# Altium footprint library Electronic Devices_LIB.PcbLib: 410 footprints (part 5 of 26)
Each footprint in its own frame and in the unit in brackets; x right, y up, seen from the top. Pads: shape width x height; smd on the part's side, far side on the other; paste and mask are expansions set on the pad; w line width, h text height; cw(c..) or ccw(c..) is an arc to the next point about the centre after c.
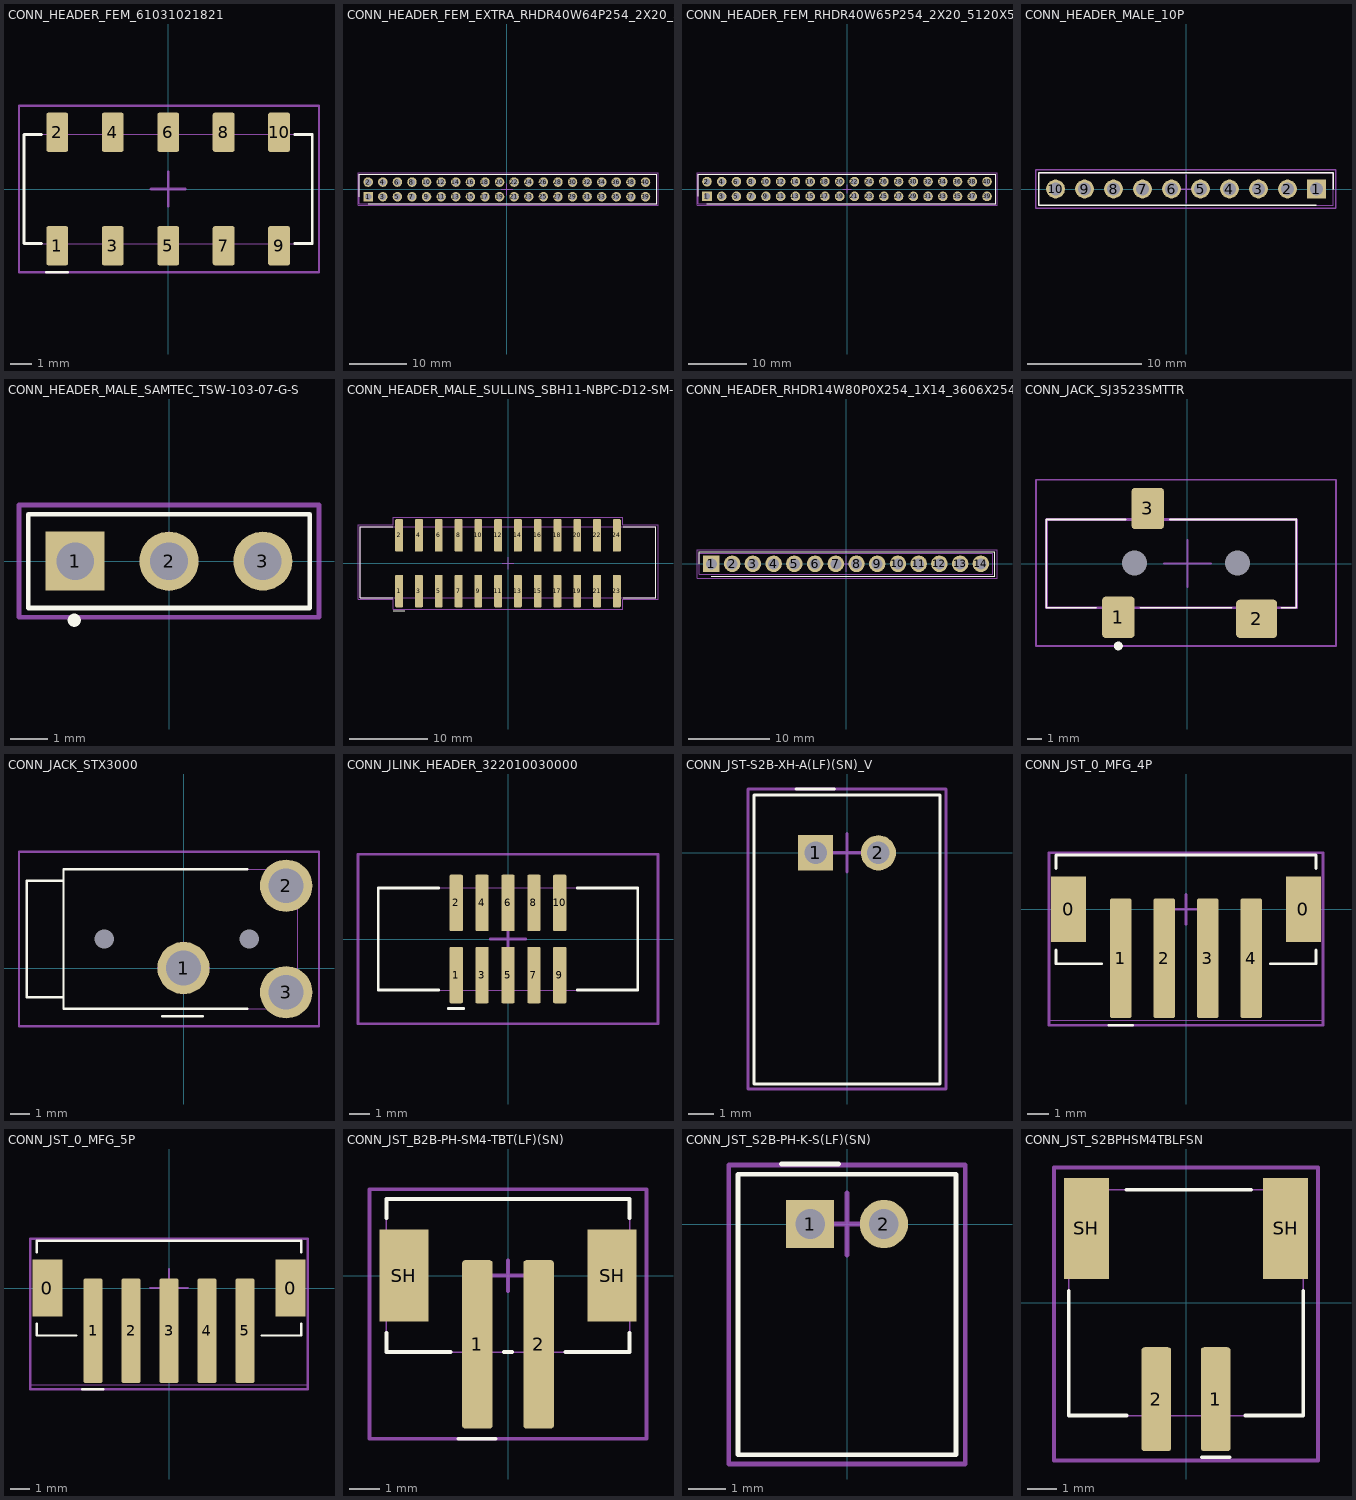
[diagram p4: the footprints below, top view; thin cyan lines are the x and y axes]

## CONN_HEADER_FEM_61031021821 [mm] "0.100\" (2.54mm)"
height 7.6
pads (10):
  rrect20% 1x1.8 smd: 1(-5.08,-2.6) 2(-5.08,2.6) 3(-2.54,-2.6) 4(-2.54,2.6) 5(0,-2.6) 6(0,2.6) 7(2.54,-2.6) 8(2.54,2.6) 9(5.08,-2.6) 10(5.08,2.6)
Top Overlay:
  lines w0.127: -5.8,-2.5 -6.6,-2.5 -6.6,2.5 -5.8,2.5 ; -5.588,-3.81 -4.597,-3.81 ; 5.8,-2.5 6.6,-2.5 6.6,2.5 5.8,2.5
Top Assembly:
  lines w0.051: -6.6,-2.5 -6.6,2.5 6.6,2.5 6.6,-2.5 -6.6,-2.5
Top Courtyard:
  lines w0.1: -6.833,-3.81 -6.833,3.81 6.909,3.81 6.909,-3.81 -6.833,-3.81
  lines w0.127: -0.787,0 0,0 ; 0,-0.787 0,0 ; 0,0.787 0,0 ; 0.787,0 0,0
3D body "61031021821.stp": height 8.5, standoff 0.05, extent -6.6,-3.475 6.6,3.525

## CONN_HEADER_FEM_EXTRA_RHDR40W64P254_2X20_5130X500X1375P [mm]
pads (40):
  rect 1.65x1.65 hole 1.1: 1(-24.13,-1.27)
  round 1.65 hole 1.1: 2(-24.13,1.27) 3(-21.59,-1.27) 4(-21.59,1.27) 5(-19.05,-1.27) 6(-19.05,1.27) 7(-16.51,-1.27) 8(-16.51,1.27) 9(-13.97,-1.27) 10(-13.97,1.27) 11(-11.43,-1.27) 12(-11.43,1.27) 13(-8.89,-1.27) 14(-8.89,1.27) 15(-6.35,-1.27) 16(-6.35,1.27) 17(-3.81,-1.27) 18(-3.81,1.27) 19(-1.27,-1.27) 20(-1.27,1.27) 21(1.27,-1.27) 22(1.27,1.27) 23(3.81,-1.27) 24(3.81,1.27) 25(6.35,-1.27) 26(6.35,1.27) 27(8.89,-1.27) 28(8.89,1.27) 29(11.43,-1.27) 30(11.43,1.27) 31(13.97,-1.27) 32(13.97,1.27) 33(16.51,-1.27) 34(16.51,1.27) 35(19.05,-1.27) 36(19.05,1.27) 37(21.59,-1.27) 38(21.59,1.27) 39(24.13,-1.27) 40(24.13,1.27)
Top Overlay:
  lines w0.127: -25.65,-1.27 -25.65,2.65 26.05,2.65 26.05,-2.5 -24.13,-2.5
Top Assembly:
  text ".Designator" at -2.286,-0.186 h0.51
Top Courtyard:
  lines w0.127: -0.991,0 0,0 ; 0,-0.991 0,0 ; 0,0.991 0,0 ; 0.991,0 0,0 ; -25.9,-2.75 -25.9,2.9 26.3,2.9 26.3,-2.75 -25.9,-2.75
Top 3D Body:
  lines w0.1: -25.65,-2.5 -25.65,2.65 26.05,2.65 26.05,-2.5 -25.65,-2.5
3D body "PRT-16764.stp": height 13.75, standoff -10.05, extent -25.65,-2.5 25.65,2.5

## CONN_HEADER_FEM_RHDR40W65P254_2X20_5120X504X850P [mm] "2.54mm"
height 8.51
pads (40):
  rect 1.65x1.65 hole 1.1: 1(-24.13,-1.27)
  round 1.65 hole 1.1: 2(-24.13,1.27) 3(-21.59,-1.27) 4(-21.59,1.27) 5(-19.05,-1.27) 6(-19.05,1.27) 7(-16.51,-1.27) 8(-16.51,1.27) 9(-13.97,-1.27) 10(-13.97,1.27) 11(-11.43,-1.27) 12(-11.43,1.27) 13(-8.89,-1.27) 14(-8.89,1.27) 15(-6.35,-1.27) 16(-6.35,1.27) 17(-3.81,-1.27) 18(-3.81,1.27) 19(-1.27,-1.27) 20(-1.27,1.27) 21(1.27,-1.27) 22(1.27,1.27) 23(3.81,-1.27) 24(3.81,1.27) 25(6.35,-1.27) 26(6.35,1.27) 27(8.89,-1.27) 28(8.89,1.27) 29(11.43,-1.27) 30(11.43,1.27) 31(13.97,-1.27) 32(13.97,1.27) 33(16.51,-1.27) 34(16.51,1.27) 35(19.05,-1.27) 36(19.05,1.27) 37(21.59,-1.27) 38(21.59,1.27) 39(24.13,-1.27) 40(24.13,1.27)
Top Overlay:
  lines w0.127: -25.6,-1.27 -25.6,2.52 25.6,2.52 25.6,-2.52 -24.13,-2.52
Top Assembly:
  text ".Designator" at -4.75,0.017 h0.51
Top Courtyard:
  lines w0.127: -0.711,0 0,0 ; 0,-0.711 0,0 ; 0,0.711 0,0 ; 0.711,0 0,0 ; -25.85,-2.77 -25.85,2.77 25.85,2.77 25.85,-2.77 -25.85,-2.77
Top 3D Body:
  lines w0.1: -25.6,-2.52 -25.6,2.52 25.6,2.52 25.6,-2.52 -25.6,-2.52
3D body "M20-7832046.stp": height 8.5, standoff -3, extent -25.6,-2.52 25.6,2.52

## CONN_HEADER_MALE_10P [mm]
pads (10):
  rect 1.65x1.65 hole 1.1: 1(11.43,0)
  round 1.65 hole 1.1: 2(8.89,0) 3(6.35,0) 4(3.81,0) 5(1.27,0) 6(-1.27,0) 7(-3.81,0) 8(-6.35,0) 9(-8.89,0) 10(-11.43,0)
Top Overlay:
  lines w0.127: 11.43,-1.435 -12.891,-1.435 -12.891,1.435 12.89,1.435 12.89,0
Top Assembly:
  lines w0.051: -12.891,-1.435 12.89,-1.435 12.89,1.435 -12.891,1.435 -12.891,-1.435
Top Courtyard:
  lines w0.127: -1.25,0 0,0 ; 0,-1.25 0,0 ; 0,1.25 0,0 ; 1.25,0 0,0 ; -13.141,-1.685 13.14,-1.685 13.14,1.685 -13.141,1.685 -13.141,-1.685
3D body "PH1-10-UA.stp": height 8.86, standoff -3.43, extent -12.7,-1.245 12.7,1.245

## CONN_HEADER_MALE_SAMTEC_TSW-103-07-G-S [mm]
pads (3):
  rect 1.6x1.6 hole 1.02: 1(-2.54,0)
  round 1.6 hole 1.02: 2(0,0) 3(2.54,0)
Top Overlay:
  circle w0.2: c-2.565,-1.6 r0.077
  lines w0.127: -3.81,-1.27 -3.81,1.27 3.81,1.27 3.81,-1.27 -3.81,-1.27
Top Assembly:
  lines w0.051: -3.81,-1.27 -3.81,1.27 ; -3.81,-1.27 3.81,-1.27 ; -3.81,-1.27 -3.81,1.27 ; -3.81,1.27 3.81,1.27 ; -3.81,1.27 3.81,1.27 ; 3.81,-1.27 3.81,1.27 ; 3.81,-1.27 3.81,1.27
  text ".Designator" at -2.616,-0.186 h0.51
Top Courtyard:
  lines w0.127: -0.737,0 0,0 ; 0,-0.737 0,0 ; 0,0.737 0,0 ; 0.737,0 0,0 ; -4.06,-1.52 -4.06,1.52 4.06,1.52 4.06,-1.52 -4.06,-1.52
3D body "TSW-103-07-G-S.step": height 8.39, standoff -2.53, extent -3.81,-1.27 3.937,1.27

## CONN_HEADER_MALE_SULLINS_SBH11-NBPC-D12-SM-BK [mm] "PITCH 2.54mm"
height 10.74
pads (24):
  rrect20% 1x4.15 smd: 1(-13.97,-3.575) 2(-13.97,3.575) 3(-11.43,-3.575) 4(-11.43,3.575) 5(-8.89,-3.575) 6(-8.89,3.575) 7(-6.35,-3.575) 8(-6.35,3.575) 9(-3.81,-3.575) 10(-3.81,3.575) 11(-1.27,-3.575) 12(-1.27,3.575) 13(1.27,-3.575) 14(1.27,3.575) 15(3.81,-3.575) 16(3.81,3.575) 17(6.35,-3.575) 18(6.35,3.575) 19(8.89,-3.575) 20(8.89,3.575) 21(11.43,-3.575) 22(11.43,3.575) 23(13.97,-3.575) 24(13.97,3.575)
Top Overlay:
  lines w0.127: -14.8,-4.4 -18.99,-4.4 -18.99,4.7 -14.8,4.7 ; -14.732,-6.096 -13.259,-6.096 ; 14.8,-4.4 18.99,-4.4 18.99,4.7 14.8,4.7
Top Assembly:
  lines w0.051: -18.99,-4.4 -18.99,4.7 18.99,4.7 18.99,-4.4 -18.99,-4.4
  text ".Designator" at -2.235,0.042 h0.51
Top Courtyard:
  lines w0.127: -0.762,0 0,0 ; 0,-0.762 0,0 ; 0,0.762 0,0 ; 0.762,0 0,0 ; -19.25,-4.65 -19.25,4.95 -14.72,4.95 -14.72,5.9 14.72,5.9 14.72,4.95 19.25,4.95 19.25,-4.65 14.72,-4.65 14.72,-5.9 -14.72,-5.9 -14.72,-4.65 -19.25,-4.65
3D body "step_temp.STEP": height 10.5, standoff -0.12, extent -18.914,-5.119 19.066,5.181

## CONN_HEADER_RHDR14W80P0X254_1X14_3606X254X850P [mm]
pads (14):
  rect 2.025x2.025 hole 1.35: 1(-16.51,0)
  round 2.025 hole 1.35: 2(-13.97,0) 3(-11.43,0) 4(-8.89,0) 5(-6.35,0) 6(-3.81,0) 7(-1.27,0) 8(1.27,0) 9(3.81,0) 10(6.35,0) 11(8.89,0) 12(11.43,0) 13(13.97,0) 14(16.51,0)
Top Overlay:
  lines w0.127: -18.03,0 -18.03,1.5 18.24,1.5 18.24,-1.5 -16.51,-1.5
Top Courtyard:
  lines w0.127: -1,0 0,0 ; 0,-1 0,0 ; 0,1 0,0 ; 1,0 0,0 ; -18.28,-1.75 -18.28,1.705 18.49,1.705 18.49,-1.75 -18.28,-1.75
Top 3D Body:
  lines w0.1: -18.03,-1.27 17.99,-1.27 17.99,1.27 -18.03,1.27 -18.03,-1.27
3D body "PPTC141LFBN-RC.stp": height 8.5, standoff -3.5, extent -18.03,-1.27 18.03,1.27

## CONN_JACK_SJ3523SMTTR [mm]
pads (5):
  rrect20% 2.2x2.8 smd: 1(-4.7,-3.65) 3(-2.7,3.75)
  rrect20% 2.8x2.6 smd: 2(4.7,-3.75)
  round 0.85 hole 1.7 unplated: MH1(-3.6,0.05) MH2(3.4,0.05)
Top Overlay:
  lines w0.127: -6.2,-3 -9.6,-3 -9.6,3 -4.2,3 ; -3.2,-3 3,-3 ; -1.2,3 7.4,3 ; 6.4,-3 7.4,-3 7.4,-1.45 7.4,3.05
  lines w0.3: -4.85,-5.6 cw(c-4.7,-5.6) -4.55,-5.6 cw(c-4.7,-5.6) -4.85,-5.6
Top Courtyard:
  lines w0.127: -1.6,0 0,0 ; 0,-1.6 0,0 ; 0,1.6 0,0 ; 1.6,0 0,0 ; -10.3,-5.6 -10.3,5.7 10.1,5.7 10.1,-5.6 -10.3,-5.6
Top 3D Body:
  lines w0.2: -9.6,-3 -9.6,3 7.4,3 7.4,-3 -9.6,-3
3D body "SJ-3523-SMT-TR.stp": height 5.2, standoff -0.6, extent -9.45,-4.45 9.55,4.55

## CONN_JACK_STX3000 [mm] "3.50mm (0.141\", 1/8\", Mini Plug)"
height 8.2
pads (5):
  round 2.704 hole 1.803: 1(0,0) 2(5.3,4.25) 3(5.3,-1.25)
  round 0.5 hole 1 unplated: MH1(-4.1,1.5) MH2(3.4,1.5)
Top Overlay:
  lines w0.127: -1.1,-2.5 1,-2.5 ; -6.2,-2.1 -6.2,-1.5 ; -6.2,-2.1 -6.2,-1.5 ; -6.2,-2.1 3.3,-2.1 -6.2,-2.1 ; -6.2,-1.5 -8.1,-1.5 -8.1,4.5 -6.2,4.5 ; -6.2,-1.5 -6.2,4.5 ; -6.2,4.5 -6.2,5.1 ; -6.2,4.5 -6.2,5.1 ; -6.2,5.1 3.3,5.1 -6.2,5.1
Top Assembly:
  lines w0.051: -8.1,-1.5 -8.1,4.5 -6.2,4.5 -6.2,-1.5 -8.1,-1.5 ; -6.2,-2.1 5.9,-2.1 5.9,5.1 -6.2,5.1 -6.2,-2.1
  text ".Designator" at -2.949,0.72 h0.51
Top Courtyard:
  lines w0.127: -1.3,0 0,0 ; 0,-1.3 0,0 ; 0,1.3 0,0 ; 1.3,0 0,0 ; -8.5,-3 7,-3 7,6 -8.5,6 -8.5,-3
3D body "STX-3000.stp": height 5.99, standoff -2.66, extent -8.15,-2.06 5.816,5.14

## CONN_JLINK_HEADER_322010030000 [mm]
pads (10):
  rrect20% 0.65x2.77 smd: 1(-2.54,-1.765) 2(-2.54,1.765) 3(-1.27,-1.765) 4(-1.27,1.765) 5(0,-1.765) 6(0,1.765) 7(1.27,-1.765) 8(1.27,1.765) 9(2.54,-1.765) 10(2.54,1.765)
Top Overlay:
  lines w0.127: -3.4,-2.5 -6.35,-2.5 -6.35,2.5 -3.4,2.5 ; -2.921,-3.404 -2.159,-3.404 ; 3.4,-2.5 6.35,-2.5 6.35,2.5 3.4,2.5
Top Assembly:
  lines w0.051: -6.35,-2.5 6.35,-2.5 6.35,2.5 -6.35,2.5 -6.35,-2.5
  text ".Designator" at -2.642,-0.263 h0.51
Top Courtyard:
  lines w0.127: -0.864,0 0,0 ; 0,-0.864 0,0 ; 0,0.864 0,0 ; 0.864,0 0,0 ; -7.35,-4.15 7.35,-4.15 7.35,4.15 -7.35,4.15 -7.35,-4.15
3D body "3220-10-0300-00 3D.stp": height 5.2, standoff 0, extent -6.325,-2.743 6.375,2.757

## CONN_JST-S2B-XH-A(LF)(SN)_V [mm] "Header, 2-Leads, Body 7.4x11.5mm, Pitch 2.5mm"
height 6.1
pads (2):
  rect 1.4x1.4 hole 0.9: 1(-1.25,0)
  round 1.4 hole 0.9: 2(1.25,0)
Top Overlay:
  lines w0.127: -3.697,2.3 -3.7,2.3 ; -2.032,2.54 -0.508,2.54 ; -3.7,2.3 3.7,2.3 3.7,-9.2 -3.7,-9.2 -3.7,2.3
Top Assembly:
  lines w0.051: -3.7,-9.2 3.7,-9.2 3.7,2.3 -3.7,2.3 -3.7,-9.2
  text ".Designator" at -2.489,-4.225 h0.51
Top Courtyard:
  lines w0.127: -0.762,0 0,0 ; 0,-0.762 0,0 ; 0,0.762 0,0 ; 0.762,0 0,0 ; -3.937,-9.398 3.937,-9.398 3.937,2.54 -3.937,2.54 -3.937,-9.398
3D body "S2B-XH-A -LF--SN---3DModel-STEP-1.STEP": height 6.11, standoff -3.39, extent -3.7,-9.179 3.7,2.321

## CONN_JST_0_MFG_4P [mm] "Connector Header Surface Mount 4 position 0.079\" (2.00mm)"
height 6.6
pads (6):
  rect 1.6x3 smd paste+0: 0(-5.4,0) 0(5.4,0)
  rrect20% 1x5.5 smd paste+0: 1(-3,-2.25) 2(-1,-2.25) 3(1,-2.25) 4(3,-2.25)
Top Overlay:
  lines w0.127: -5.975,-1.875 -5.975,-2.5 -3.875,-2.5 ; -5.975,1.875 -5.975,2.5 5.975,2.5 5.975,1.875 ; -3.556,-5.334 -2.464,-5.334 ; 3.875,-2.5 5.975,-2.5 5.975,-1.875
Top Assembly:
  lines w0.051: -6.3,-5.1 -6.3,2.6 6.3,2.6 6.3,-5.1 -6.3,-5.1
  text ".Designator" at -2.388,-0.567 h0.51
Top Courtyard:
  lines w0.127: -0.686,0 0,0 ; 0,-0.686 0,0 ; 0,0.686 0,0 ; 0.686,0 0,0 ; -6.3,-5.334 -6.3,2.6 6.3,2.6 6.3,-5.334 -6.3,-5.334
3D body "Conn_JST_B4B-PH-SM4-TBT_LF_SN_eec.STEP": height 0.25, standoff 0, extent -6.3,-5.1 6.3,2.6

## CONN_JST_0_MFG_5P [mm] "Connector Header Surface Mount 5 position 0.079\" (2.00mm)"
height 6.6
pads (7):
  rect 1.6x3 smd paste+0: 0(-6.4,0) 0(6.4,0)
  rrect20% 1x5.5 smd paste+0: 1(-4,-2.25) 2(-2,-2.25) 3(0,-2.25) 4(2,-2.25) 5(4,-2.25)
Top Overlay:
  lines w0.127: -6.975,-1.875 -6.975,-2.5 -4.875,-2.5 ; -6.975,1.875 -6.975,2.5 6.975,2.5 6.975,1.875 ; -4.559,-5.334 -3.467,-5.334 ; 4.875,-2.5 6.975,-2.5 6.975,-1.875
Top Assembly:
  lines w0.051: -7.3,-5.1 7.3,-5.1 7.3,2.6 -7.3,2.6 -7.3,-5.1
  text ".Designator" at -2.438,-0.745 h0.51
Top Courtyard:
  lines w0.127: -0.991,0 0,0 ; 0,-0.991 0,0 ; 0,0.991 0,0 ; 0.991,0 0,0 ; -7.3,-5.334 7.3,-5.334 7.3,2.6 -7.3,2.6 -7.3,-5.334
3D body "Conn_JST_B5B-PH-SM4-TBT_LF_SN_eec.STEP": height 0.25, standoff 0, extent -7.3,-5.1 7.3,2.6

## CONN_JST_B2B-PH-SM4-TBT(LF)(SN) [mm]
pads (4):
  rrect20% 1x5.5 smd: 1(-1,-2.25) 2(1,-2.25)
  rect 1.6x3 smd: SH(-3.4,0) SH(3.4,0)
Top Overlay:
  lines w0.127: -3.975,-1.875 -3.975,-2.5 -1.875,-2.5 ; -3.975,1.875 -3.975,2.5 3.975,2.5 3.975,1.875 ; -1.626,-5.334 -0.406,-5.334 ; -0.125,-2.5 0.125,-2.5 ; 1.875,-2.5 3.975,-2.5 3.975,-1.875
Top Assembly:
  lines w0.051: -3.975,-2.5 -3.975,2.5 3.975,2.5 3.975,-2.5 -3.975,-2.5
  text ".Designator" at -2.489,-0.542 h0.51
Top Courtyard:
  lines w0.127: -0.5,0 0.5,0 ; 0,-0.5 0,0.5 ; -4.521,-5.334 -4.521,2.819 4.521,2.819 4.521,-5.334 -4.521,-5.334
3D body "Conn_JST_B2B-PH-SM4-TBT_LF_SN_eec.STEP": height 0.25, standoff 0, extent -4.3,-5.1 4.3,2.6

## CONN_JST_S2B-PH-K-S(LF)(SN) [mm] "pitch 2.00mm; 2-contacts; THT"
height 4.8
pads (2):
  rect 1.308x1.308 / inner round 1.308 / far side rect 1.308x1.308 hole 0.8: 1(-1,0)
  round 1.308 hole 0.8: 2(1,0)
Top Overlay:
  lines w0.127: -1.778,1.626 -0.229,1.626 ; -2.95,-6.25 -2.95,1.35 2.95,1.35 2.95,-6.25 -2.95,-6.25
Top Assembly:
  lines w0.051: -2.95,-6.25 -2.95,1.35 2.95,1.35 2.95,-6.25 -2.95,-6.25
  text ".Designator" at -2.667,-0.872 h0.51
Top Courtyard:
  lines w0.127: -0.838,0 0,0 ; 0,-0.838 0,0 ; 0,0.838 0,0 ; 0.838,0 0,0 ; -3.2,-6.5 -3.2,1.6 3.2,1.6 3.2,-6.5 -3.2,-6.5
3D body "step_temp.STEP": height 4.8, standoff -3.38, extent -2.95,-6.25 2.95,1.35

## CONN_JST_S2BPHSM4TBLFSN [mm] "Surface Mount, Right Angle 2 position 0.079\" (2.00mm"
height 5.51
pads (4):
  rrect20% 1x3.5 smd: 1(1,-3.25) 2(-1,-3.25)
  rect 1.5x3.4 smd: SH(-3.35,2.5) SH(3.35,2.5)
Top Overlay:
  lines w0.127: -3.95,0.4 -3.95,-3.8 -2,-3.8 ; -2,3.8 2.2,3.8 ; 0.533,-5.207 1.473,-5.207 ; 2,-3.8 3.95,-3.8 3.95,0.4
Top Assembly:
  lines w0.051: -3.95,-3.8 3.95,-3.8 3.95,3.8 -3.95,3.8 -3.95,-3.8
  text ".Designator" at -2.54,-0.313 h0.51
Top Courtyard:
  lines w0.127: -4.445,-5.309 -4.445,4.547 4.445,4.547 4.445,-5.309 -4.445,-5.309
3D body "S2B-PH-SM4-TB_LF__SN_.stp": height 5.6, standoff 0, extent -3.963,-4.808 3.937,3.792